# Altium footprint library Library.PcbLib: 292 footprints (part 14 of 20)
Each footprint in its own frame and in the unit in brackets; x right, y up, seen from the top. Pads: shape width x height; smd on the part's side, far side on the other; paste and mask are expansions set on the pad; w line width, h text height; cw(c..) or ccw(c..) is an arc to the next point about the centre after c.
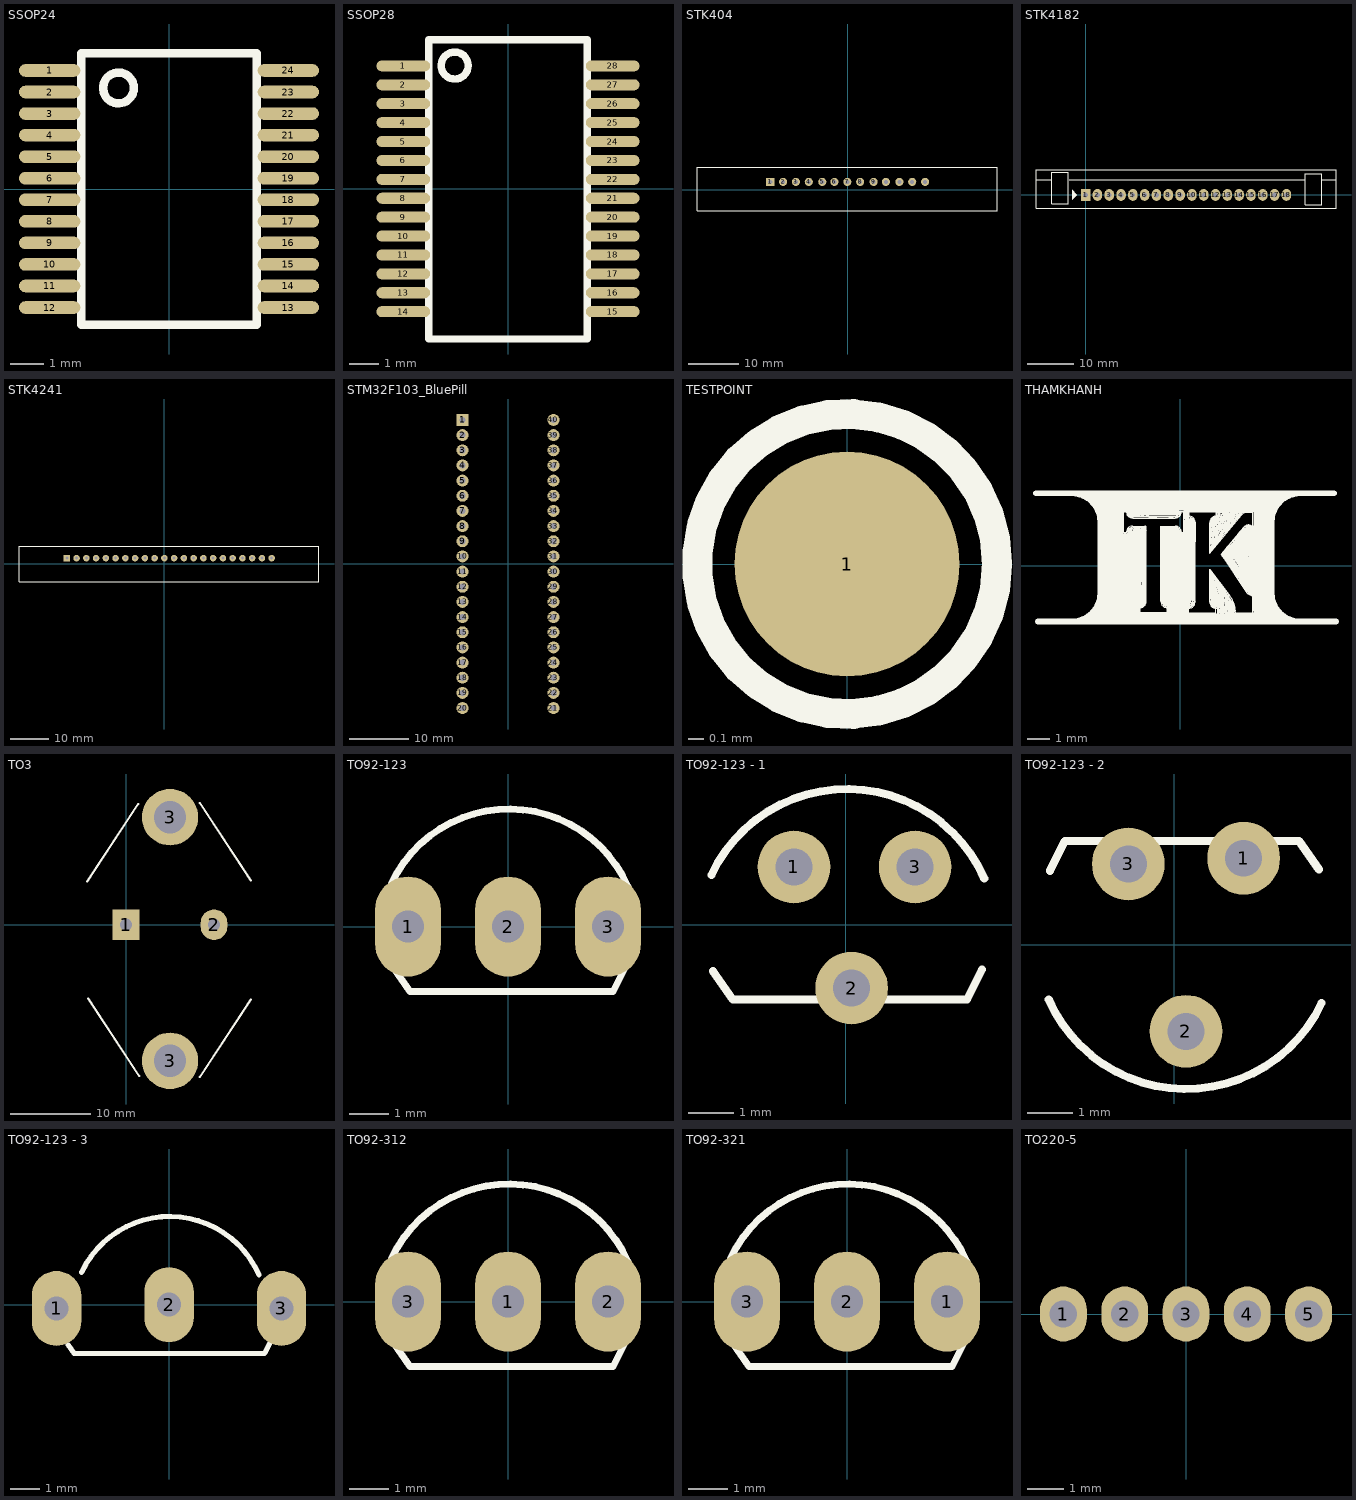
[diagram p13: the footprints below, top view; thin cyan lines are the x and y axes]

## SSOP24 [mm] "SSOP-24P-pitch 0.65"
pads (24):
  oval 1.85x0.38 smd: 1(-3.6,3.575) 2(-3.6,2.925) 3(-3.6,2.275) 4(-3.6,1.625) 5(-3.6,0.975) 6(-3.6,0.325) 7(-3.6,-0.325) 8(-3.6,-0.975) 9(-3.6,-1.625) 10(-3.6,-2.275) 11(-3.6,-2.925) 12(-3.6,-3.575) 13(3.6,-3.575) 14(3.6,-2.925) 15(3.6,-2.275) 16(3.6,-1.625) 17(3.6,-0.975) 18(3.6,-0.325) 19(3.6,0.325) 20(3.6,0.975) 21(3.6,1.625) 22(3.6,2.275) 23(3.6,2.925) 24(3.6,3.575)
Top Overlay:
  circle w0.254: c-1.524,3.048 r0.464
  lines w0.254: -2.65,-4.1 2.65,-4.1 2.65,4.1 -2.65,4.1 -2.65,-4.1
3D body "SSOP-24_5.3x8.2mm_P0.65mm.step": height 2.1, standoff 0, extent -3.9,-4.1 3.9,4.1

## SSOP28 [mm]
pads (28):
  oval 1.85x0.38 smd: 1(-3.6,4.225) 2(-3.6,3.575) 3(-3.6,2.925) 4(-3.6,2.275) 5(-3.6,1.625) 6(-3.6,0.975) 7(-3.6,0.325) 8(-3.6,-0.325) 9(-3.6,-0.975) 10(-3.6,-1.625) 11(-3.6,-2.275) 12(-3.6,-2.925) 13(-3.6,-3.575) 14(-3.6,-4.225) 15(3.6,-4.225) 16(3.6,-3.575) 17(3.6,-2.925) 18(3.6,-2.275) 19(3.6,-1.625) 20(3.6,-0.975) 21(3.6,-0.325) 22(3.6,0.325) 23(3.6,0.975) 24(3.6,1.625) 25(3.6,2.275) 26(3.6,2.925) 27(3.6,3.575) 28(3.6,4.225)
Top Overlay:
  circle w0.254: c-1.834,4.237 r0.464
  lines w0.254: -2.731,-5.165 2.731,-5.165 2.731,5.128 -2.731,5.128 -2.731,-5.165
3D body "User Library-SSOP-28-1.step": height 2.15, standoff 0, extent -3.878,-5.165 3.878,5.165

## STK404 [mm]
pads (13):
  rect 1.6x1.6 hole 0.8: 1(-15.367,1.524)
  round 1.6 hole 0.8: 2(-12.827,1.524) 3(-10.287,1.524) 4(-7.747,1.524) 5(-5.08,1.524) 6(-2.667,1.524) 7(-0.127,1.524) 8(2.413,1.524) 9(5.08,1.524) 10(7.493,1.524) 11(10.16,1.524) 12(12.7,1.524) 13(15.24,1.524)
Top Overlay:
  lines w0.2: -29.845,-4.191 -29.845,4.445 -26.543,4.445 29.464,4.445 29.464,-4.191 -29.845,-4.191
3D body: height 45, standoff 43, extent -44.45,10.058 48.26,44.45
3D body: height 38, standoff 36, extent -44.45,10.058 48.26,44.45
3D body: height 31, standoff 29, extent -44.45,10.058 48.26,44.45
3D body: height 66, standoff 64, extent -44.45,10.058 48.26,44.45
3D body: height 73, standoff 71, extent -44.45,10.058 48.26,44.45
3D body: height 59, standoff 57, extent -44.45,10.058 48.26,44.45
3D body: height 81, standoff 78, extent -44.45,10.058 48.26,44.45
3D body: height 24, standoff 22, extent -44.45,10.058 48.26,44.45
3D body: height 52, standoff 50, extent -44.45,10.058 48.26,44.45
3D body: height 10, standoff 8, extent -44.45,10.058 48.26,44.45
3D body: height 17, standoff 15, extent -44.45,10.058 48.26,44.45
3D body: height 3, standoff 0, extent -44.45,10.058 48.26,44.45
3D body: height 81, standoff 0, extent -44.45,4.572 48.26,10.058
3D body "User Library-STK404-130S.step": height 1.9, standoff -34.01, extent -29.727,-4.115 29.473,4.445

## STK4182 [mil] "Pin to pin 100mil, 18 pin"
pads (18):
  rect 80x100 hole 40: 1(0,0)
  oval 80x100 hole 40: 2(100,0) 3(200,0) 4(300,0) 5(400,0) 6(500,0) 7(600,0) 8(700,0) 9(800,0) 10(900,0) 11(1000,0) 12(1100,0) 13(1200,0) 14(1300,0) 15(1400,0) 16(1500,0) 17(1600,0) 18(1700,0)
Top Overlay:
  region: -115,42.5 -115,-42.5 -75,-2.5 -75,2.5
  lines w10: -420,130 -285,130 ; -140,130 1860,130 ; 2000,130 2120,130 ; -420,-115 2120,-115 2120,215 -420,215 -420,-115 ; -285,-75 -285,190 -145,190 -145,-75 -285,-75 ; 1860,-85 2000,-85 2000,180 1860,180 1860,-85

## STK4241 [mm]
pads (22):
  rect 1.7x1.7 hole 0.8: 1(-25.4,1.397)
  round 1.7 hole 0.8: 2(-22.86,1.397) 3(-20.32,1.397) 4(-17.78,1.397) 5(-15.24,1.397) 6(-12.7,1.397) 7(-10.16,1.397) 8(-7.62,1.397) 9(-5.08,1.397) 10(-2.54,1.397) 11(0,1.397) 12(2.54,1.397) 13(5.08,1.397) 14(7.62,1.397) 15(10.16,1.397) 16(12.7,1.397) 17(15.24,1.397) 18(17.78,1.397) 19(20.32,1.397) 20(22.86,1.397) 21(25.4,1.397) 22(27.94,1.397)
Top Overlay:
  lines w0.2: -37.846,-4.699 -37.846,4.445 -26.543,4.445 40.259,4.445 40.259,-4.699 -37.846,-4.699
3D body: height 45, standoff 43, extent -44.45,10.058 48.26,44.45
3D body: height 38, standoff 36, extent -44.45,10.058 48.26,44.45
3D body: height 31, standoff 29, extent -44.45,10.058 48.26,44.45
3D body: height 66, standoff 64, extent -44.45,10.058 48.26,44.45
3D body: height 73, standoff 71, extent -44.45,10.058 48.26,44.45
3D body: height 59, standoff 57, extent -44.45,10.058 48.26,44.45
3D body: height 81, standoff 78, extent -44.45,10.058 48.26,44.45
3D body: height 24, standoff 22, extent -44.45,10.058 48.26,44.45
3D body: height 52, standoff 50, extent -44.45,10.058 48.26,44.45
3D body: height 10, standoff 8, extent -44.45,10.058 48.26,44.45
3D body: height 17, standoff 15, extent -44.45,10.058 48.26,44.45
3D body: height 3, standoff 0, extent -44.45,10.058 48.26,44.45
3D body: height 81, standoff 0, extent -44.45,4.572 48.26,10.058
3D body "User Library-STK 4241V.step": height 3.5, standoff -56, extent -37.73,-4.677 40.27,4.373

## STM32F103_BluePill [mm]
pads (40):
  rect 2x2 hole 1.02: 1(-7.62,24.13)
  round 2 hole 1.02: 2(-7.62,21.59) 3(-7.62,19.05) 4(-7.62,16.51) 5(-7.62,13.97) 6(-7.62,11.43) 7(-7.62,8.89) 8(-7.62,6.35) 9(-7.62,3.81) 10(-7.62,1.27) 11(-7.62,-1.27) 12(-7.62,-3.81) 13(-7.62,-6.35) 14(-7.62,-8.89) 15(-7.62,-11.43) 16(-7.62,-13.97) 17(-7.62,-16.51) 18(-7.62,-19.05) 19(-7.62,-21.59) 20(-7.62,-24.13) 21(7.62,-24.13) 22(7.62,-21.59) 23(7.62,-19.05) 24(7.62,-16.51) 25(7.62,-13.97) 26(7.62,-11.43) 27(7.62,-8.89) 28(7.62,-6.35) 29(7.62,-3.81) 30(7.62,-1.27) 31(7.62,1.27) 32(7.62,3.81) 33(7.62,6.35) 34(7.62,8.89) 35(7.62,11.43) 36(7.62,13.97) 37(7.62,16.51) 38(7.62,19.05) 39(7.62,21.59) 40(7.62,24.13)
3D body "Blue Pill STM32.step": height 22, standoff 1.9, extent -11.407,-27.16 11.453,31.261
3D body "61302011821.stp": height 8.51, standoff -3.09, extent -8.87,-25.65 -6.37,25.65
3D body "61302011821.stp": height 8.51, standoff -3.09, extent 6.37,-25.65 8.87,25.65

## TESTPOINT [mm]
pads (1):
  round 1.5 smd: 1(0,0)
Top Overlay:
  circle w0.2: c0,0 r1

## THAMKHANH [mm]
Top Overlay:
  drawing of 1111 lines, arcs and shapes, not listed

## TO3 [mil]
pads (4):
  rect 130x150 hole 60: 1(0,0)
  oval 130x150 hole 60: 2(430,0)
  round 275.59 hole 157.48: 3(215,-665) 3(215,525)
Top Overlay:
  lines w10: -190,210 60,590 ; -185,-360 65,-740 ; 360,-745 610,-365 ; 360,595 610,215
3D body "User Library-2N3055-TO-3.step": height 322.83, standoff -468.5, extent -277.13,-837.71 707.12,697.62

## TO92-123 [mil] "TO-92"
height 200
pads (3):
  oval 66x100 hole 32: 1(-100,0) 2(0,0) 3(100,0)
Top Overlay:
  lines w7: -116.52,43.21 cw(c0.97,-12.43) 119.94,39.97 ; -115.34,-40.24 -98,-65 105,-65 118,-39
3D body "SW3dPS-TO92.STEP": height 245.04, standoff -199.79, extent -108.87,-65.56 108.86,95

## TO92-123 - 1 [mil] "TO-92"
height 200
pads (3):
  round 62.99 hole 32: 1(-45,50) 2(5,-55) 3(60,50)
Top Overlay:
  lines w7: -116.52,43.21 cw(c0.97,-12.43) 119.94,39.97 ; -115.34,-40.24 -98,-65 105,-65 118,-39
3D body "User Library-TO-92_CF127SB127.step": height 334.65, standoff -157.48, extent -93.39,-57.87 103.4,98.43

## TO92-123 - 2 [mil] "TO-92"
height 200
pads (3):
  round 62.99 hole 32: 1(60,75) 2(10,-75) 3(-40,70)
Top Overlay:
  lines w7: -108.97,-47.4 ccw(c10,5) 127.49,-50.64 ; -108,64 -95,90 108,90 125.34,65.24
3D body "User Library-TO-92_CB127SF254.step": height 334.65, standoff -157.48, extent -88.4,-123.43 108.4,82.88

## TO92-123 - 3 [mil] "TO-92"
height 200
pads (3):
  oval 66x100 hole 32: 1(-150,-5) 2(0,0) 3(150,-5)
Top Overlay:
  lines w7: -134.46,-53.63 -126.5,-65 127.5,-65 136,-48 ; -116.52,43.21 cw(c0.97,-12.43) 119.94,39.97
3D body "User Library-TO-92_SS254.step": height 394.65, standoff -97.48, extent -159.06,-58.47 159.05,93.89

## TO92-312 [mil] "TO-92"
height 200
pads (3):
  oval 66x100 hole 32: 1(0,0) 2(100,0) 3(-100,0)
Top Overlay:
  lines w7: -116.52,43.21 cw(c0.97,-12.43) 119.94,39.97 ; -115.34,-40.24 -98,-65 105,-65 118,-39
3D body "SW3dPS-TO92.STEP": height 245.04, standoff -199.79, extent -108.87,-65.56 108.86,95

## TO92-321 [mil] "TO-92"
height 200
pads (3):
  oval 66x100 hole 32: 1(100,0) 2(0,0) 3(-100,0)
Top Overlay:
  lines w7: -116.52,43.21 cw(c0.97,-12.43) 119.94,39.97 ; -115.34,-40.24 -98,-65 105,-65 118,-39
3D body "SW3dPS-TO92.STEP": height 245.04, standoff -199.79, extent -108.87,-65.56 108.86,95

## TO220-5 [mil]
pads (5):
  oval 51.18x60 hole 30: 1(-133.86,0) 2(-66.93,0) 3(0,0) 4(66.93,0) 5(133.86,0)
3D body "ALSRobot-TO-220-5H.STEP": height 829.2, standoff 245.35, extent -200.04,-75 200.04,103